# Altium schematic symbol library Diode - Rectifier.SchLib: 777 symbols (part 3 of 4)
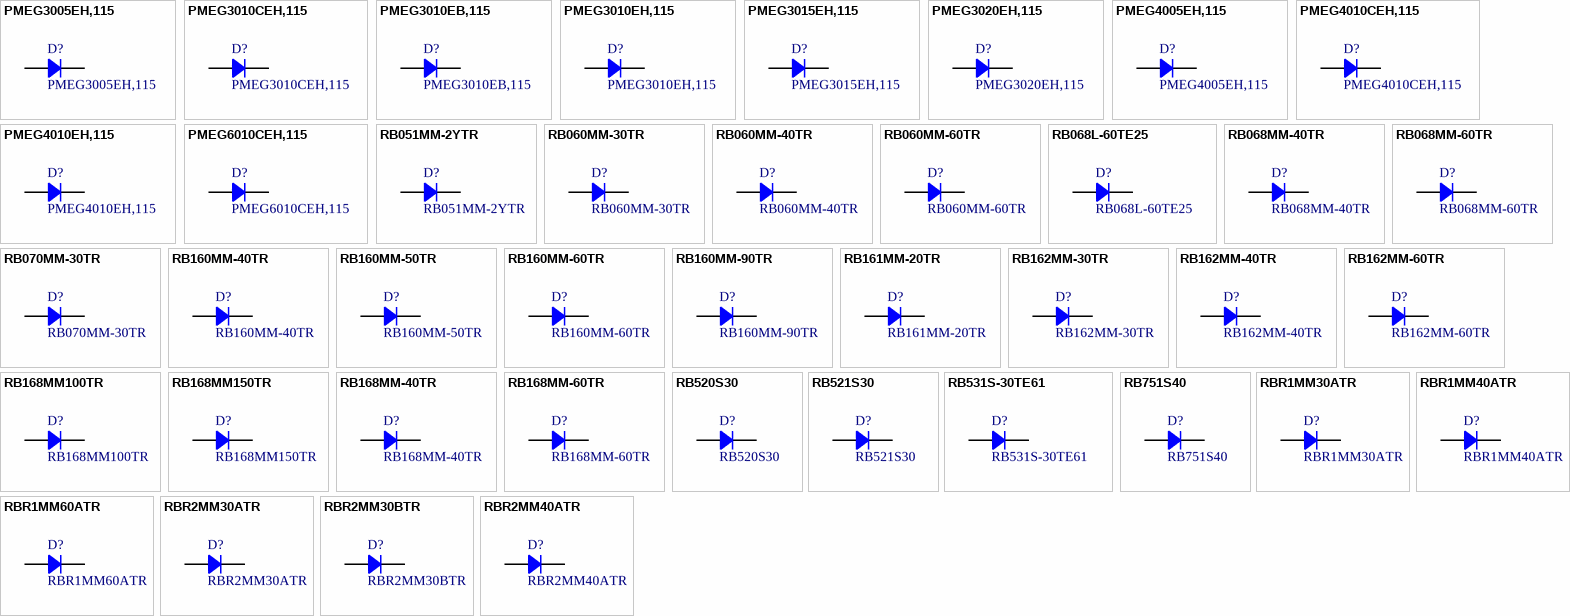
[diagram p21: symbols PMEG3005EH,115 to RBR2MM40ATR]

## RB168MM150TR
designator D?
DIODE SCHOTTKY 150V 1A PMDU; Manufacturer: Rohm Semiconductor; Current Reverse Leakage @ Vr: 4uA @ 150V; Voltage Forward (Vf): 840mV @ 1A; Part Number: RB168MM150TR; PartId: 29299; Supplier 1: Digi-Key; Supplier Part Number 1: RB168MM150CT-ND; ComponentLink1Description: Datasheet; ComponentLink1URL: http://rohmfs.rohm.com/en/products/databook/datasheet/discrete/diode/schottky_barrier/rb168mm150.pdf; ComponentLink2Description: Digi-Key Listing; ComponentLink2URL: https://www.digikey.com/product-detail/en/rohm-semiconductor/RB168MM150TR/RB168MM150CT-ND/5813364; Junction Operating Temperature: 150C (Max); Price: 0.51; Type: Schottky; Device Package: SOD-123F; Voltage DC Reverse (Vr): 150V; Current Rectified: 1A
footprint SOD123F
pins: 1, 2

## RB168MM-40TR
designator D?
DIODE SCHOTTKY 40V 1A PMDU; Manufacturer: Rohm Semiconductor; Current Reverse Leakage @ Vr: 550nA @ 40V; Voltage Forward (Vf): 650mV @ 1A; Part Number: RB168MM-40TR; PartId: 29297; Supplier 1: Digi-Key; Supplier Part Number 1: RB168MM-40CT-ND; ComponentLink1Description: Datasheet; ComponentLink1URL: http://rohmfs.rohm.com/en/products/databook/datasheet/discrete/diode/schottky_barrier/rb168mm-40.pdf; ComponentLink2Description: Digi-Key Listing; ComponentLink2URL: https://www.digikey.com/product-detail/en/rohm-semiconductor/RB168MM-40TR/RB168MM-40CT-ND/5720312; Junction Operating Temperature: 150C (Max); Price: 0.51; Type: Schottky; Device Package: SOD-123F; Voltage DC Reverse (Vr): 40V; Current Rectified: 1A
footprint SOD123F
pins: 1, 2

## RB168MM-60TR
designator D?
DIODE SCHOTTKY 60V 1A PMDU; Manufacturer: Rohm Semiconductor; Current Reverse Leakage @ Vr: 1.5uA @ 60V; Voltage Forward (Vf): 680mV @ 1A; Part Number: RB168MM-60TR; PartId: 29298; Supplier 1: Digi-Key; Supplier Part Number 1: RB168MM-60CT-ND; ComponentLink1Description: Datasheet; ComponentLink1URL: http://rohmfs.rohm.com/en/products/databook/datasheet/discrete/diode/schottky_barrier/rb168mm-60.pdf; ComponentLink2Description: Digi-Key Listing; ComponentLink2URL: https://www.digikey.com/product-detail/en/rohm-semiconductor/RB168MM-60TR/RB168MM-60CT-ND/5813365; Junction Operating Temperature: 150C (Max); Price: 0.51; Type: Schottky; Device Package: SOD-123F; Voltage DC Reverse (Vr): 60V; Current Rectified: 1A
footprint SOD123F
pins: 1, 2

## RB520S30
designator D?
DIODE SCHOTTKY 30V 200MA SOD523F; Manufacturer: Fairchild Semiconductor; Type: Surface Mount; Current Reverse Leakage @ Vr: 1uA @ 10V; Voltage Forward (Vf): 600mV @ 200mA; Part Number: RB520S30; PartId: 7142; Supplier 1: Digi-Key; Supplier Part Number 1: RB520S30TR-ND; ComponentLink1Description: Datasheet; ComponentLink1URL: http://www.fairchildsemi.com/datasheets/RB/RB520S30.pdf; ComponentLink2Description: Digi-Key Listing; ComponentLink2URL: http://www.digikey.ca/product-detail/en/RB520S30/RB520S30TR-ND/1955134; Junction Operating Temperature: -55C ~ 125C; Price: 0.0455; Device Package: SC-79, SOD-523F; Reverse Recovery Time (trr): -; Voltage DC Reverse (Vr): 30V; Current Rectified: 200mA
footprint SOD523F
pins: 1, 2

## RB521S30
designator D?
DIODE SCHOTTKY 30V 200MA SOD523F; Manufacturer: Fairchild Semiconductor; Type: Surface Mount; Current Reverse Leakage @ Vr: 30uA @ 10V; Voltage Forward (Vf): 500mV @ 200mA; Part Number: RB521S30; PartId: 7144; Supplier 1: Digi-Key; Supplier Part Number 1: RB521S30TR-ND; ComponentLink1Description: Datasheet; ComponentLink1URL: http://www.fairchildsemi.com/datasheets/RB/RB521S30.pdf; ComponentLink2Description: Digi-Key Listing; ComponentLink2URL: http://www.digikey.ca/product-detail/en/RB521S30/RB521S30TR-ND/1955135; Junction Operating Temperature: -55C ~ 125C; Price: 0.0455; Device Package: SC-79, SOD-523F; Reverse Recovery Time (trr): -; Voltage DC Reverse (Vr): 30V; Current Rectified: 200mA
footprint SOD523F
pins: 1, 2

## RB531S-30TE61
designator D?
DIODE SCHOTTKY 30V 100MA EMD2; Manufacturer: Rohm Semiconductor; Type: Surface Mount; Current Reverse Leakage @ Vr: 10uA @ 10V; Voltage Forward (Vf): 350mV @ 10mA; Part Number: RB531S-30TE61; PartId: 7148; Supplier 1: Digi-Key; Supplier Part Number 1: RB531S-30TE61TR-ND; ComponentLink1Description: Datasheet; ComponentLink1URL: http://rohmfs.rohm.com/en/products/databook/datasheet/discrete/diode/schottky_barrier/rb531s-30.pdf; ComponentLink2Description: Digi-Key Listing; ComponentLink2URL: http://www.digikey.ca/product-detail/en/RB531S-30TE61/RB531S-30TE61TR-ND/2615623; Junction Operating Temperature: 125C (Max); Price: 0.0915; Device Package: SC-79, SOD-523; Reverse Recovery Time (trr): -; Voltage DC Reverse (Vr): 30V; Current Rectified: 100mA
footprint SOD523F
pins: 1, 2

## RB751S40
designator D?
DIODE SCHOTTKY 40V 30MA SOD523F; Manufacturer: Fairchild Semiconductor; Type: Surface Mount; Current Reverse Leakage @ Vr: 500nA @ 10V; Voltage Forward (Vf): 370mV @ 1mA; Part Number: RB751S40; PartId: 7143; Supplier 1: Digi-Key; Supplier Part Number 1: RB751S40TR-ND; ComponentLink1Description: Datasheet; ComponentLink1URL: http://www.fairchildsemi.com/datasheets/RB/RB751S40.pdf; ComponentLink2Description: Digi-Key Listing; ComponentLink2URL: http://www.digikey.ca/product-detail/en/RB751S40/RB751S40TR-ND/1955136; Junction Operating Temperature: -55C ~ 125C; Price: 0.0455; Device Package: SC-79, SOD-523F; Reverse Recovery Time (trr): -; Voltage DC Reverse (Vr): 40V; Current Rectified: 30mA
footprint SOD523F
pins: 1, 2

## RBR1MM30ATR
designator D?
DIODE SCHOTTKY 30V 1A PMDU; Manufacturer: Rohm Semiconductor; Current Reverse Leakage @ Vr: 50uA @ 30V; Voltage Forward (Vf): 480mV @ 1A; Part Number: RBR1MM30ATR; PartId: 29303; Supplier 1: Digi-Key; Supplier Part Number 1: RBR1MM30ACT-ND; ComponentLink1Description: Datasheet; ComponentLink1URL: http://rohmfs.rohm.com/en/products/databook/datasheet/discrete/diode/schottky_barrier/rbr1mm30a.pdf; ComponentLink2Description: Digi-Key Listing; ComponentLink2URL: https://www.digikey.com/product-detail/en/rohm-semiconductor/RBR1MM30ATR/RBR1MM30ACT-ND/5813369; Junction Operating Temperature: 150C (Max); Price: 0.52; Type: Schottky; Device Package: SOD-123F; Voltage DC Reverse (Vr): 30V; Current Rectified: 1A
footprint SOD123F
pins: 1, 2

## RBR1MM40ATR
designator D?
DIODE SCHOTTKY 40V 1A PMDU; Manufacturer: Rohm Semiconductor; Current Reverse Leakage @ Vr: 50uA @ 40V; Voltage Forward (Vf): 520mV @ 1A; Part Number: RBR1MM40ATR; PartId: 29301; Supplier 1: Digi-Key; Supplier Part Number 1: RBR1MM40ACT-ND; ComponentLink1Description: Datasheet; ComponentLink1URL: http://rohmfs.rohm.com/en/products/databook/datasheet/discrete/diode/schottky_barrier/rbr1mm40a.pdf; ComponentLink2Description: Digi-Key Listing; ComponentLink2URL: https://www.digikey.com/product-detail/en/rohm-semiconductor/RBR1MM40ATR/RBR1MM40ACT-ND/5813370; Junction Operating Temperature: 150C (Max); Price: 0.52; Type: Schottky; Device Package: SOD-123F; Voltage DC Reverse (Vr): 40V; Current Rectified: 1A
footprint SOD123F
pins: 1, 2

## RBR1MM60ATR
designator D?
DIODE SCHOTTKY 60V 1A PMDU; Manufacturer: Rohm Semiconductor; Current Reverse Leakage @ Vr: 75uA @ 60V; Voltage Forward (Vf): 530mV @ 1A; Part Number: RBR1MM60ATR; PartId: 29695; Supplier 1: Digi-Key; Supplier Part Number 1: RBR1MM60ACT-ND; ComponentLink1Description: Datasheet; ComponentLink1URL: http://rohmfs.rohm.com/en/products/databook/datasheet/discrete/diode/schottky_barrier/rbr1mm60a.pdf; ComponentLink2Description: Digi-Key Listing; ComponentLink2URL: https://www.digikey.com/product-detail/en/rohm-semiconductor/RBR1MM60ATR/RBR1MM60ACT-ND/5813371; Junction Operating Temperature: 150C (Max); Price: 0.52; Type: Schottky; Device Package: SOD-123F; Voltage DC Reverse (Vr): 60V; Current Rectified: 1A
footprint SOD123F
pins: 1, 2

## RBR2MM30ATR
designator D?
DIODE SCHOTTKY 30V 2A PMDU; Manufacturer: Rohm Semiconductor; Current Reverse Leakage @ Vr: 50uA @ 30V; Voltage Forward (Vf): 530mV @ 2A; Part Number: RBR2MM30ATR; PartId: 29241; Supplier 1: Digi-Key; Supplier Part Number 1: RBR2MM30ACT-ND; ComponentLink1Description: Datasheet; ComponentLink1URL: http://rohmfs.rohm.com/en/products/databook/datasheet/discrete/diode/schottky_barrier/rbr2mm30a.pdf; ComponentLink2Description: Digi-Key Listing; ComponentLink2URL: https://www.digikey.com/product-detail/en/rohm-semiconductor/RBR2MM30ATR/RBR2MM30ACT-ND/5813376; Junction Operating Temperature: 150C (Max); Price: 0.53; Type: Schottky; Device Package: SOD-123F; Voltage DC Reverse (Vr): 30V; Current Rectified: 2A
footprint SOD123F
pins: 1, 2

## RBR2MM30BTR
designator D?
DIODE SCHOTTKY 30V 2A PMDU; Manufacturer: Rohm Semiconductor; Current Reverse Leakage @ Vr: 80uA @ 30V; Voltage Forward (Vf): 490mV @ 2A; Part Number: RBR2MM30BTR; PartId: 29339; Supplier 1: Digi-Key; Supplier Part Number 1: RBR2MM30BCT-ND; ComponentLink1Description: Datasheet; ComponentLink1URL: http://rohmfs.rohm.com/en/products/databook/datasheet/discrete/diode/schottky_barrier/rbr2mm30b.pdf; ComponentLink2Description: Digi-Key Listing; ComponentLink2URL: https://www.digikey.com/product-detail/en/rohm-semiconductor/RBR2MM30BTR/RBR2MM30BCT-ND/5813377; Junction Operating Temperature: 150C (Max); Price: 0.55; Type: Schottky; Device Package: SOD-123F; Voltage DC Reverse (Vr): 30V; Current Rectified: 2A
footprint SOD123F
pins: 1, 2

## RBR2MM40ATR
designator D?
DIODE SCHOTTKY 40V 2A PMDU; Manufacturer: Rohm Semiconductor; Current Reverse Leakage @ Vr: 50uA @ 40V; Voltage Forward (Vf): 620mV @ 2A; Part Number: RBR2MM40ATR; PartId: 29306; Supplier 1: Digi-Key; Supplier Part Number 1: RBR2MM40ACT-ND; ComponentLink1Description: Datasheet; ComponentLink1URL: http://rohmfs.rohm.com/en/products/databook/datasheet/discrete/diode/schottky_barrier/rbr2mm40a.pdf; ComponentLink2Description: Digi-Key Listing; ComponentLink2URL: https://www.digikey.com/product-detail/en/rohm-semiconductor/RBR2MM40ATR/RBR2MM40ACT-ND/5813378; Junction Operating Temperature: 150C (Max); Price: 0.53; Type: Schottky; Device Package: SOD-123F; Voltage DC Reverse (Vr): 40V; Current Rectified: 2A
footprint SOD123F
pins: 1, 2

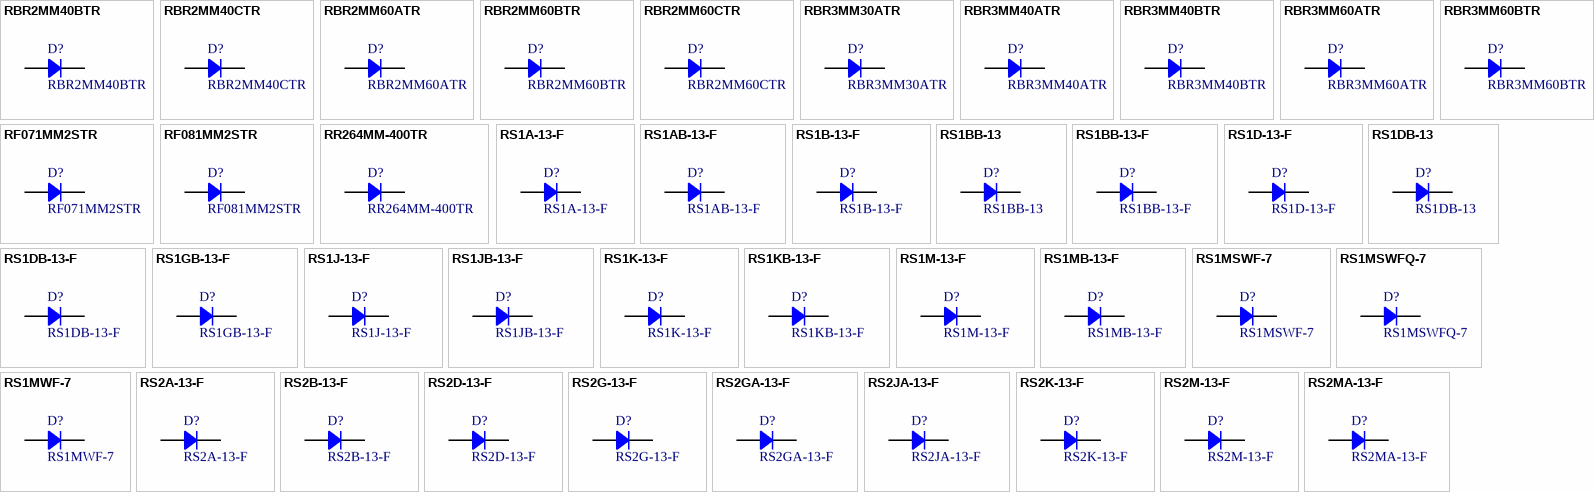
[diagram p11: symbols RBR2MM40BTR to RS2MA-13-F]

## RBR2MM40BTR
designator D?
DIODE SCHOTTKY 40V 2A PMDU; Manufacturer: Rohm Semiconductor; Current Reverse Leakage @ Vr: 80uA @ 40V; Voltage Forward (Vf): 560mV @ 2A; Part Number: RBR2MM40BTR; PartId: 29310; Supplier 1: Digi-Key; Supplier Part Number 1: RBR2MM40BCT-ND; ComponentLink1Description: Datasheet; ComponentLink1URL: http://rohmfs.rohm.com/en/products/databook/datasheet/discrete/diode/schottky_barrier/rbr2mm40b.pdf; ComponentLink2Description: Digi-Key Listing; ComponentLink2URL: https://www.digikey.com/product-detail/en/rohm-semiconductor/RBR2MM40BTR/RBR2MM40BCT-ND/5813379; Junction Operating Temperature: 150C (Max); Price: 0.55; Type: Schottky; Device Package: SOD-123F; Voltage DC Reverse (Vr): 40V; Current Rectified: 2A
footprint SOD123F
pins: 1, 2

## RBR2MM40CTR
designator D?
DIODE SCHOTTKY 40V 2A PMDU; Manufacturer: Rohm Semiconductor; Current Reverse Leakage @ Vr: 100uA @ 40V; Voltage Forward (Vf): 540mV @ 2A; Part Number: RBR2MM40CTR; PartId: 29281; Supplier 1: Digi-Key; Supplier Part Number 1: RBR2MM40CCT-ND; ComponentLink1Description: Datasheet; ComponentLink1URL: http://rohmfs.rohm.com/en/products/databook/datasheet/discrete/diode/schottky_barrier/rbr2mm40c.pdf; ComponentLink2Description: Digi-Key Listing; ComponentLink2URL: https://www.digikey.com/product-detail/en/rohm-semiconductor/RBR2MM40CTR/RBR2MM40CCT-ND/5813380; Junction Operating Temperature: 150C (Max); Price: 0.42; Type: Schottky; Device Package: SOD-123F; Voltage DC Reverse (Vr): 40V; Current Rectified: 2A
footprint SOD123F
pins: 1, 2

## RBR2MM60ATR
designator D?
DIODE SCHOTTKY 60V 2A PMDU; Manufacturer: Rohm Semiconductor; Current Reverse Leakage @ Vr: 75uA @ 60V; Voltage Forward (Vf): 650mV @ 2A; Part Number: RBR2MM60ATR; PartId: 29305; Supplier 1: Digi-Key; Supplier Part Number 1: RBR2MM60ACT-ND; ComponentLink1Description: Datasheet; ComponentLink1URL: http://rohmfs.rohm.com/en/products/databook/datasheet/discrete/diode/schottky_barrier/rbr2mm60a.pdf; ComponentLink2Description: Digi-Key Listing; ComponentLink2URL: https://www.digikey.com/product-detail/en/rohm-semiconductor/RBR2MM60ATR/RBR2MM60ACT-ND/5813381; Junction Operating Temperature: 150C (Max); Price: 0.53; Type: Schottky; Device Package: SOD-123F; Voltage DC Reverse (Vr): 60V; Current Rectified: 2A
footprint SOD123F
pins: 1, 2

## RBR2MM60BTR
designator D?
DIODE SCHOTTKY 60V 2A PMDU; Manufacturer: Rohm Semiconductor; Current Reverse Leakage @ Vr: 100uA @ 60V; Voltage Forward (Vf): 580mV @ 2A; Part Number: RBR2MM60BTR; PartId: 29311; Supplier 1: Digi-Key; Supplier Part Number 1: RBR2MM60BCT-ND; ComponentLink1Description: Datasheet; ComponentLink1URL: http://rohmfs.rohm.com/en/products/databook/datasheet/discrete/diode/schottky_barrier/rbr2mm60b.pdf; ComponentLink2Description: Digi-Key Listing; ComponentLink2URL: https://www.digikey.com/product-detail/en/rohm-semiconductor/RBR2MM60BTR/RBR2MM60BCT-ND/5813382; Junction Operating Temperature: 150C (Max); Price: 0.55; Type: Schottky; Device Package: SOD-123F; Voltage DC Reverse (Vr): 60V; Current Rectified: 2A
footprint SOD123F
pins: 1, 2

## RBR2MM60CTR
designator D?
DIODE SCHOTTKY 60V 2A PMDU; Manufacturer: Rohm Semiconductor; Current Reverse Leakage @ Vr: 120uA @ 60V; Voltage Forward (Vf): 550mV @ 2A; Part Number: RBR2MM60CTR; PartId: 29280; Supplier 1: Digi-Key; Supplier Part Number 1: RBR2MM60CCT-ND; ComponentLink1Description: Datasheet; ComponentLink1URL: http://rohmfs.rohm.com/en/products/databook/datasheet/discrete/diode/schottky_barrier/rbr2mm60c.pdf; ComponentLink2Description: Digi-Key Listing; ComponentLink2URL: https://www.digikey.com/product-detail/en/rohm-semiconductor/RBR2MM60CTR/RBR2MM60CCT-ND/5813383; Junction Operating Temperature: 150C (Max); Price: 0.42; Type: Schottky; Device Package: SOD-123F; Voltage DC Reverse (Vr): 60V; Current Rectified: 2A
footprint SOD123F
pins: 1, 2

## RBR3MM30ATR
designator D?
DIODE SCHOTTKY 30V 3A PMDU; Manufacturer: Rohm Semiconductor; Current Reverse Leakage @ Vr: 100uA @ 30V; Voltage Forward (Vf): 510mV @ 3A; Part Number: RBR3MM30ATR; PartId: 29329; Supplier 1: Digi-Key; Supplier Part Number 1: RBR3MM30ACT-ND; ComponentLink1Description: Datasheet; ComponentLink1URL: http://rohmfs.rohm.com/en/products/databook/datasheet/discrete/diode/schottky_barrier/rbr3mm30a.pdf; ComponentLink2Description: Digi-Key Listing; ComponentLink2URL: https://www.digikey.com/product-detail/en/rohm-semiconductor/RBR3MM30ATR/RBR3MM30ACT-ND/5813390; Junction Operating Temperature: 150C (Max); Price: 0.44; Type: Schottky; Device Package: SOD-123F; Voltage DC Reverse (Vr): 30V; Current Rectified: 3A
footprint SOD123F
pins: 1, 2

## RBR3MM40ATR
designator D?
DIODE SCHOTTKY 40V 3A PMDU; Manufacturer: Rohm Semiconductor; Current Reverse Leakage @ Vr: 80uA @ 40V; Voltage Forward (Vf): 620mV @ 3A; Part Number: RBR3MM40ATR; PartId: 29244; Supplier 1: Digi-Key; Supplier Part Number 1: RBR3MM40ACT-ND; ComponentLink1Description: Datasheet; ComponentLink1URL: http://rohmfs.rohm.com/en/products/databook/datasheet/discrete/diode/schottky_barrier/rbr3mm40a.pdf; ComponentLink2Description: Digi-Key Listing; ComponentLink2URL: https://www.digikey.com/product-detail/en/rohm-semiconductor/RBR3MM40ATR/RBR3MM40ACT-ND/5813391; Junction Operating Temperature: 150C (Max); Price: 0.4; Type: Schottky; Device Package: SOD-123F; Voltage DC Reverse (Vr): 40V; Current Rectified: 3A
footprint SOD123F
pins: 1, 2

## RBR3MM40BTR
designator D?
DIODE SCHOTTKY 40V 3A PMDU; Manufacturer: Rohm Semiconductor; Current Reverse Leakage @ Vr: 100uA @ 40V; Voltage Forward (Vf): 580mV @ 3A; Part Number: RBR3MM40BTR; PartId: 29284; Supplier 1: Digi-Key; Supplier Part Number 1: RBR3MM40BCT-ND; ComponentLink1Description: Datasheet; ComponentLink1URL: http://rohmfs.rohm.com/en/products/databook/datasheet/discrete/diode/schottky_barrier/rbr3mm40b.pdf; ComponentLink2Description: Digi-Key Listing; ComponentLink2URL: https://www.digikey.com/product-detail/en/rohm-semiconductor/RBR3MM40BTR/RBR3MM40BCT-ND/5813392; Junction Operating Temperature: 150C (Max); Price: 0.44; Type: Schottky; Device Package: SOD-123F; Voltage DC Reverse (Vr): 40V; Current Rectified: 3A
footprint SOD123F
pins: 1, 2

## RBR3MM60ATR
designator D?
DIODE SCHOTTKY 60V 3A PMDU; Manufacturer: Rohm Semiconductor; Current Reverse Leakage @ Vr: 100uA @ 60V; Voltage Forward (Vf): 660mV @ 3A; Part Number: RBR3MM60ATR; PartId: 29273; Supplier 1: Digi-Key; Supplier Part Number 1: RBR3MM60ACT-ND; ComponentLink1Description: Datasheet; ComponentLink1URL: http://rohmfs.rohm.com/en/products/databook/datasheet/discrete/diode/schottky_barrier/rbr3mm60a.pdf; ComponentLink2Description: Digi-Key Listing; ComponentLink2URL: https://www.digikey.com/product-detail/en/rohm-semiconductor/RBR3MM60ATR/RBR3MM60ACT-ND/5813393; Junction Operating Temperature: 150C (Max); Price: 0.4; Type: Schottky; Device Package: SOD-123F; Voltage DC Reverse (Vr): 60V; Current Rectified: 3A
footprint SOD123F
pins: 1, 2

## RBR3MM60BTR
designator D?
DIODE SCHOTTKY 60V 3A PMDU; Manufacturer: Rohm Semiconductor; Current Reverse Leakage @ Vr: 120uA @ 60V; Voltage Forward (Vf): 610mV @ 3A; Part Number: RBR3MM60BTR; PartId: 29286; Supplier 1: Digi-Key; Supplier Part Number 1: RBR3MM60BCT-ND; ComponentLink1Description: Datasheet; ComponentLink1URL: http://rohmfs.rohm.com/en/products/databook/datasheet/discrete/diode/schottky_barrier/rbr3mm60b.pdf; ComponentLink2Description: Digi-Key Listing; ComponentLink2URL: https://www.digikey.com/product-detail/en/rohm-semiconductor/RBR3MM60BTR/RBR3MM60BCT-ND/5813394; Junction Operating Temperature: 150C (Max); Price: 0.44; Type: Schottky; Device Package: SOD-123F; Voltage DC Reverse (Vr): 60V; Current Rectified: 3A
footprint SOD123F
pins: 1, 2

## RF071MM2STR
designator D?
DIODE GEN PURP 200V 700MA PMDU; Manufacturer: Rohm Semiconductor; Type: Standard; Current Reverse Leakage @ Vr: 10uA @ 200V; Reverse Recovery Time (trr): 25ns; Voltage Forward (Vf): 850mV @ 700mA; Part Number: RF071MM2STR; PartId: 29230; Supplier 1: Digi-Key; Supplier Part Number 1: RF071MM2SCT-ND; ComponentLink1Description: Datasheet; ComponentLink1URL: http://rohmfs.rohm.com/en/products/databook/datasheet/discrete/diode/fast_recovery/rf071mm2s.pdf; ComponentLink2Description: Digi-Key Listing; ComponentLink2URL: https://www.digikey.com/product-detail/en/rohm-semiconductor/RF071MM2STR/RF071MM2SCT-ND/5001884; Junction Operating Temperature: 150C (Max); Price: 0.54; Device Package: SOD-123F; Voltage DC Reverse (Vr): 200V; Current Rectified: 700mA
footprint SOD123F
pins: 1, 2

## RF081MM2STR
designator D?
DIODE GEN PURP 200V 800MA PMDU; Manufacturer: Rohm Semiconductor; Type: Standard; Current Reverse Leakage @ Vr: 10uA @ 200V; Reverse Recovery Time (trr): 25ns; Voltage Forward (Vf): 950mV @ 800mA; Part Number: RF081MM2STR; PartId: 29270; Supplier 1: Digi-Key; Supplier Part Number 1: RF081MM2SCT-ND; ComponentLink1Description: Datasheet; ComponentLink1URL: http://rohmfs.rohm.com/en/products/databook/datasheet/discrete/diode/fast_recovery/rf081mm2s.pdf; ComponentLink2Description: Digi-Key Listing; ComponentLink2URL: https://www.digikey.com/product-detail/en/rohm-semiconductor/RF081MM2STR/RF081MM2SCT-ND/5001885; Junction Operating Temperature: 150C (Max); Price: 0.39; Device Package: SOD-123F; Voltage DC Reverse (Vr): 200V; Current Rectified: 800mA
footprint SOD123F
pins: 1, 2

## RR264MM-400TR
designator D?
DIODE GEN PURP 400V 1A PMDU; Manufacturer: Rohm Semiconductor; Type: Standard; Current Reverse Leakage @ Vr: 10uA @ 400V; Voltage Forward (Vf): 1.1V @ 700mA; Part Number: RR264MM-400TR; PartId: 29179; Supplier 1: Digi-Key; Supplier Part Number 1: RR264MM-400CT-ND; ComponentLink1Description: Datasheet; ComponentLink1URL: http://rohmfs.rohm.com/en/products/databook/datasheet/discrete/diode/rectifier/rr264mm-400.pdf; ComponentLink2Description: Digi-Key Listing; ComponentLink2URL: https://www.digikey.com/product-detail/en/rohm-semiconductor/RR264MM-400TR/RR264MM-400CT-ND/5001886; Junction Operating Temperature: 150C (Max); Price: 0.29; Device Package: SOD-123F; Voltage DC Reverse (Vr): 400V; Current Rectified: 1A
footprint SOD123F
pins: 1, 2

## RS1A-13-F
designator D?
DIODE GEN PURP 50V 1A SMA; Manufacturer: Diodes Incorporated; Type: Standard; Current Reverse Leakage @ Vr: 5uA @ 50V; Reverse Recovery Time (trr): 150ns; Voltage Forward (Vf): 1.3V @ 1A; Part Number: RS1A-13-F; PartId: 16347; Supplier 1: Digi-Key; Supplier Part Number 1: RS1A-FDITR-ND; ComponentLink1Description: Datasheet; ComponentLink1URL: http://www.diodes.com/_files/datasheets/ds15002.pdf; ComponentLink2Description: Digi-Key Listing; ComponentLink2URL: https://www.digikey.com/product-detail/en/diodes-incorporated/RS1A-13-F/RS1A-FDITR-ND/751523; Junction Operating Temperature: -65C ~ 150C; Price: 0.072; Device Package: DO-214AC, SMA; Voltage DC Reverse (Vr): 50V; Current Rectified: 1A
footprint DO214AC SMA
pins: 1, 2

## RS1AB-13-F
designator D?
DIODE GEN PURP 50V 1A SMB; Manufacturer: Diodes Incorporated; Type: Standard; Current Reverse Leakage @ Vr: 5uA @ 50V; Reverse Recovery Time (trr): 150ns; Voltage Forward (Vf): 1.3V @ 1A; Part Number: RS1AB-13-F; PartId: 16274; Supplier 1: Digi-Key; Supplier Part Number 1: RS1AB-FDITR-ND; ComponentLink1Description: Datasheet; ComponentLink1URL: http://www.diodes.com/_files/datasheets/ds15002.pdf; ComponentLink2Description: Digi-Key Listing; ComponentLink2URL: https://www.digikey.com/product-detail/en/diodes-incorporated/RS1AB-13-F/RS1AB-FDITR-ND/814456; Junction Operating Temperature: -65C ~ 150C; Price: 0.0864; Device Package: DO-214AA, SMB; Voltage DC Reverse (Vr): 50V; Current Rectified: 1A
footprint DO214AA SMB
pins: 1, 2

## RS1B-13-F
designator D?
DIODE GEN PURP 100V 1A SMA; Manufacturer: Diodes Incorporated; Type: Standard; Current Reverse Leakage @ Vr: 5uA @ 100V; Reverse Recovery Time (trr): 150ns; Voltage Forward (Vf): 1.3V @ 1A; Part Number: RS1B-13-F; PartId: 16320; Supplier 1: Digi-Key; Supplier Part Number 1: RS1B-FDITR-ND; ComponentLink1Description: Datasheet; ComponentLink1URL: http://www.diodes.com/_files/datasheets/ds15002.pdf; ComponentLink2Description: Digi-Key Listing; ComponentLink2URL: https://www.digikey.com/product-detail/en/diodes-incorporated/RS1B-13-F/RS1B-FDITR-ND/717796; Junction Operating Temperature: -65C ~ 150C; Price: 0.072; Device Package: DO-214AC, SMA; Voltage DC Reverse (Vr): 100V; Current Rectified: 1A
footprint DO214AC SMA
pins: 1, 2

## RS1BB-13
designator D?
DIODE GEN PURP 100V 1A SMB; Manufacturer: Diodes Incorporated; Type: Standard; Current Reverse Leakage @ Vr: 5uA @ 100V; Reverse Recovery Time (trr): 150ns; Voltage Forward (Vf): 1.3V @ 1A; Part Number: RS1BB-13; PartId: 16310; Supplier 1: Digi-Key; Supplier Part Number 1: 981-RS1BB-13-CHP; ComponentLink1Description: Datasheet; ComponentLink1URL: //media.digikey.com/pdf/Data%20Sheets/Diodes%20PDFs/RS1.pdf; ComponentLink2Description: Digi-Key Listing; ComponentLink2URL: https://www.digikey.com/product-detail/en/diodes-incorporated/RS1BB-13/981-RS1BB-13-CHP/2348233; Junction Operating Temperature: -65C ~ 150C; Price: 0.1262; Device Package: DO-214AA, SMB; Voltage DC Reverse (Vr): 100V; Current Rectified: 1A
footprint DO214AA SMB
pins: 1, 2

## RS1BB-13-F
designator D?
DIODE GEN PURP 100V 1A SMB; Manufacturer: Diodes Incorporated; Type: Standard; Current Reverse Leakage @ Vr: 5uA @ 100V; Reverse Recovery Time (trr): 150ns; Voltage Forward (Vf): 1.3V @ 1A; Part Number: RS1BB-13-F; PartId: 16286; Supplier 1: Digi-Key; Supplier Part Number 1: RS1BB-FDITR-ND; ComponentLink1Description: Datasheet; ComponentLink1URL: http://www.diodes.com/_files/datasheets/ds15002.pdf; ComponentLink2Description: Digi-Key Listing; ComponentLink2URL: https://www.digikey.com/product-detail/en/diodes-incorporated/RS1BB-13-F/RS1BB-FDITR-ND/814460; Junction Operating Temperature: -65C ~ 150C; Price: 0.1402; Device Package: DO-214AA, SMB; Voltage DC Reverse (Vr): 100V; Current Rectified: 1A
footprint DO214AA SMB
pins: 1, 2

## RS1D-13-F
designator D?
DIODE GEN PURP 200V 1A SMA; Manufacturer: Diodes Incorporated; Type: Standard; Current Reverse Leakage @ Vr: 5uA @ 200V; Reverse Recovery Time (trr): 150ns; Voltage Forward (Vf): 1.3V @ 1A; Part Number: RS1D-13-F; PartId: 16322; Supplier 1: Digi-Key; Supplier Part Number 1: RS1D-FDITR-ND; ComponentLink1Description: Datasheet; ComponentLink1URL: http://www.diodes.com/_files/datasheets/ds15002.pdf; ComponentLink2Description: Digi-Key Listing; ComponentLink2URL: https://www.digikey.com/product-detail/en/diodes-incorporated/RS1D-13-F/RS1D-FDITR-ND/775844; Junction Operating Temperature: -65C ~ 150C; Price: 0.0743; Device Package: DO-214AC, SMA; Voltage DC Reverse (Vr): 200V; Current Rectified: 1A
footprint DO214AC SMA
pins: 1, 2

## RS1DB-13
designator D?
DIODE GEN PURP 200V 1A SMB; Manufacturer: Diodes Incorporated; Type: Standard; Current Reverse Leakage @ Vr: 5uA @ 200V; Reverse Recovery Time (trr): 150ns; Voltage Forward (Vf): 1.3V @ 1A; Part Number: RS1DB-13; PartId: 16311; Supplier 1: Digi-Key; Supplier Part Number 1: 981-RS1DB-13-CHP; ComponentLink1Description: Datasheet; ComponentLink1URL: //media.digikey.com/pdf/Data%20Sheets/Diodes%20PDFs/RS1.pdf; ComponentLink2Description: Digi-Key Listing; ComponentLink2URL: https://www.digikey.com/product-detail/en/diodes-incorporated/RS1DB-13/981-RS1DB-13-CHP/2344483; Junction Operating Temperature: -65C ~ 150C; Price: 0.1395; Device Package: DO-214AA, SMB; Voltage DC Reverse (Vr): 200V; Current Rectified: 1A
footprint DO214AA SMB
pins: 1, 2

## RS1DB-13-F
designator D?
DIODE GEN PURP 200V 1A SMB; Manufacturer: Diodes Incorporated; Type: Standard; Current Reverse Leakage @ Vr: 5uA @ 200V; Reverse Recovery Time (trr): 150ns; Voltage Forward (Vf): 1.3V @ 1A; Part Number: RS1DB-13-F; PartId: 16240; Supplier 1: Digi-Key; Supplier Part Number 1: RS1DB-FDITR-ND; ComponentLink1Description: Datasheet; ComponentLink1URL: http://www.diodes.com/_files/datasheets/ds15002.pdf; ComponentLink2Description: Digi-Key Listing; ComponentLink2URL: https://www.digikey.com/product-detail/en/diodes-incorporated/RS1DB-13-F/RS1DB-FDITR-ND/814459; Junction Operating Temperature: -65C ~ 150C; Price: 0.0882; Device Package: DO-214AA, SMB; Voltage DC Reverse (Vr): 200V; Current Rectified: 1A
footprint DO214AA SMB
pins: 1, 2

## RS1GB-13-F
designator D?
DIODE GEN PURP 400V 1A SMB; Manufacturer: Diodes Incorporated; Type: Standard; Current Reverse Leakage @ Vr: 5uA @ 400V; Reverse Recovery Time (trr): 150ns; Voltage Forward (Vf): 1.3V @ 1A; Part Number: RS1GB-13-F; PartId: 16277; Supplier 1: Digi-Key; Supplier Part Number 1: RS1GB-FDITR-ND; ComponentLink1Description: Datasheet; ComponentLink1URL: http://www.diodes.com/_files/datasheets/ds15002.pdf; ComponentLink2Description: Digi-Key Listing; ComponentLink2URL: https://www.digikey.com/product-detail/en/diodes-incorporated/RS1GB-13-F/RS1GB-FDITR-ND/765419; Junction Operating Temperature: -65C ~ 150C; Price: 0.0936; Device Package: DO-214AA, SMB; Voltage DC Reverse (Vr): 400V; Current Rectified: 1A
footprint DO214AA SMB
pins: 1, 2

## RS1J-13-F
designator D?
DIODE GEN PURP 600V 1A SMA; Manufacturer: Diodes Incorporated; Type: Standard; Current Reverse Leakage @ Vr: 5uA @ 600V; Reverse Recovery Time (trr): 250ns; Voltage Forward (Vf): 1.3V @ 1A; Part Number: RS1J-13-F; PartId: 16321; Supplier 1: Digi-Key; Supplier Part Number 1: RS1J-FDITR-ND; ComponentLink1Description: Datasheet; ComponentLink1URL: http://www.diodes.com/_files/datasheets/ds15002.pdf; ComponentLink2Description: Digi-Key Listing; ComponentLink2URL: https://www.digikey.com/product-detail/en/diodes-incorporated/RS1J-13-F/RS1J-FDITR-ND/749974; Junction Operating Temperature: -65C ~ 150C; Price: 0.072; Device Package: DO-214AC, SMA; Voltage DC Reverse (Vr): 600V; Current Rectified: 1A
footprint DO214AC SMA
pins: 1, 2

## RS1JB-13-F
designator D?
DIODE GEN PURP 600V 1A SMB; Manufacturer: Diodes Incorporated; Type: Standard; Current Reverse Leakage @ Vr: 5uA @ 600V; Reverse Recovery Time (trr): 250ns; Voltage Forward (Vf): 1.3V @ 1A; Part Number: RS1JB-13-F; PartId: 16276; Supplier 1: Digi-Key; Supplier Part Number 1: RS1JB-FDITR-ND; ComponentLink1Description: Datasheet; ComponentLink1URL: http://www.diodes.com/_files/datasheets/ds15002.pdf; ComponentLink2Description: Digi-Key Listing; ComponentLink2URL: https://www.digikey.com/product-detail/en/diodes-incorporated/RS1JB-13-F/RS1JB-FDITR-ND/814458; Junction Operating Temperature: -65C ~ 150C; Price: 0.0936; Device Package: DO-214AA, SMB; Voltage DC Reverse (Vr): 600V; Current Rectified: 1A
footprint DO214AA SMB
pins: 1, 2

## RS1K-13-F
designator D?
DIODE GEN PURP 800V 1A SMA; Manufacturer: Diodes Incorporated; Type: Standard; Current Reverse Leakage @ Vr: 5uA @ 800V; Reverse Recovery Time (trr): 500ns; Voltage Forward (Vf): 1.3V @ 1A; Part Number: RS1K-13-F; PartId: 16354; Supplier 1: Digi-Key; Supplier Part Number 1: RS1K-FDITR-ND; ComponentLink1Description: Datasheet; ComponentLink1URL: http://www.diodes.com/_files/datasheets/ds15002.pdf; ComponentLink2Description: Digi-Key Listing; ComponentLink2URL: https://www.digikey.com/product-detail/en/diodes-incorporated/RS1K-13-F/RS1K-FDITR-ND/749975; Junction Operating Temperature: -65C ~ 150C; Price: 0.0935; Device Package: DO-214AC, SMA; Voltage DC Reverse (Vr): 800V; Current Rectified: 1A
footprint DO214AC SMA
pins: 1, 2

## RS1KB-13-F
designator D?
DIODE GEN PURP 800V 1A SMB; Manufacturer: Diodes Incorporated; Type: Standard; Current Reverse Leakage @ Vr: 5uA @ 800V; Reverse Recovery Time (trr): 500ns; Voltage Forward (Vf): 1.3V @ 1A; Part Number: RS1KB-13-F; PartId: 16300; Supplier 1: Digi-Key; Supplier Part Number 1: RS1KB-FDITR-ND; ComponentLink1Description: Datasheet; ComponentLink1URL: http://www.diodes.com/_files/datasheets/ds15002.pdf; ComponentLink2Description: Digi-Key Listing; ComponentLink2URL: https://www.digikey.com/product-detail/en/diodes-incorporated/RS1KB-13-F/RS1KB-FDITR-ND/814457; Junction Operating Temperature: -65C ~ 150C; Price: 0.1039; Device Package: DO-214AA, SMB; Voltage DC Reverse (Vr): 800V; Current Rectified: 1A
footprint DO214AA SMB
pins: 1, 2

## RS1M-13-F
designator D?
DIODE GEN PURP 1KV 1A SMA; Manufacturer: Diodes Incorporated; Type: Standard; Current Reverse Leakage @ Vr: 5uA @ 1000V; Reverse Recovery Time (trr): 500ns; Voltage DC Reverse (Vr): 1000V (1kV); Voltage Forward (Vf): 1.3V @ 1A; Part Number: RS1M-13-F; PartId: 16326; Supplier 1: Digi-Key; Supplier Part Number 1: RS1M-FDITR-ND; ComponentLink1Description: Datasheet; ComponentLink1URL: http://www.diodes.com/_files/datasheets/ds15002.pdf; ComponentLink2Description: Digi-Key Listing; ComponentLink2URL: https://www.digikey.com/product-detail/en/diodes-incorporated/RS1M-13-F/RS1M-FDITR-ND/775742; Junction Operating Temperature: -65C ~ 150C; Price: 0.0935; Device Package: DO-214AC, SMA; Current Rectified: 1A
footprint DO214AC SMA
pins: 1, 2

## RS1MB-13-F
designator D?
DIODE GEN PURP 1KV 1A SMB; Manufacturer: Diodes Incorporated; Type: Standard; Current Reverse Leakage @ Vr: 5uA @ 1000V; Reverse Recovery Time (trr): 500ns; Voltage DC Reverse (Vr): 1000V (1kV); Voltage Forward (Vf): 1.3V @ 1A; Part Number: RS1MB-13-F; PartId: 16246; Supplier 1: Digi-Key; Supplier Part Number 1: RS1MB-FDITR-ND; ComponentLink1Description: Datasheet; ComponentLink1URL: http://www.diodes.com/_files/datasheets/ds15002.pdf; ComponentLink2Description: Digi-Key Listing; ComponentLink2URL: https://www.digikey.com/product-detail/en/diodes-incorporated/RS1MB-13-F/RS1MB-FDITR-ND/724960; Junction Operating Temperature: -65C ~ 150C; Price: 0.1155; Device Package: DO-214AA, SMB; Current Rectified: 1A
footprint DO214AA SMB
pins: 1, 2

## RS1MSWF-7
designator D?
DIODE RECT STD 1000V 1A SOD123F; Manufacturer: Diodes Incorporated; Type: Standard; Current Reverse Leakage @ Vr: 10uA @ 1000V; Reverse Recovery Time (trr): 500ns; Voltage DC Reverse (Vr): 1000V (1kV); Voltage Forward (Vf): 1.3V @ 1A; Part Number: RS1MSWF-7; PartId: 29274; Supplier 1: Digi-Key; Supplier Part Number 1: RS1MSWF-7DICT-ND; ComponentLink1Description: Datasheet; ComponentLink1URL: http://www.diodes.com/_files/datasheets/RS1MSWF.pdf; ComponentLink2Description: Digi-Key Listing; ComponentLink2URL: https://www.digikey.com/product-detail/en/diodes-incorporated/RS1MSWF-7/RS1MSWF-7DICT-ND/5731845; Junction Operating Temperature: -55C ~ 150C; Price: 0.4; Device Package: SOD-123F; Current Rectified: 1A
footprint SOD123F
pins: 1, 2

## RS1MSWFQ-7
designator D?
DIODE REC FAS 1000V 1A SOD123F; Manufacturer: Diodes Incorporated; Type: Standard; Current Reverse Leakage @ Vr: 10uA @ 1000V; Reverse Recovery Time (trr): 500ns; Voltage DC Reverse (Vr): 1000V (1kV); Voltage Forward (Vf): 1.3V @ 1A; Part Number: RS1MSWFQ-7; PartId: 29246; Supplier 1: Digi-Key; Supplier Part Number 1: RS1MSWFQ-7DICT-ND; ComponentLink1Description: Datasheet; ComponentLink1URL: http://www.diodes.com/_files/datasheets/RS1MSWFQ.pdf; ComponentLink2Description: Digi-Key Listing; ComponentLink2URL: https://www.digikey.com/product-detail/en/diodes-incorporated/RS1MSWFQ-7/RS1MSWFQ-7DICT-ND/5731846; Junction Operating Temperature: -55C ~ 150C; Price: 0.37; Device Package: SOD-123F; Current Rectified: 1A
footprint SOD123F
pins: 1, 2

## RS1MWF-7
designator D?
RECT FAST REC 1000V 1A SOD123F; Manufacturer: Diodes Incorporated; Type: Standard; Current Reverse Leakage @ Vr: 5uA @ 1000V; Reverse Recovery Time (trr): 500ns; Voltage DC Reverse (Vr): 1000V (1kV); Voltage Forward (Vf): 1.3V @ 1A; Part Number: RS1MWF-7; PartId: 29328; Supplier 1: Digi-Key; Supplier Part Number 1: RS1MWF-7DICT-ND; ComponentLink1Description: Datasheet; ComponentLink1URL: http://diodes.com/_files/datasheets/RS1MWF.pdf; ComponentLink2Description: Digi-Key Listing; ComponentLink2URL: https://www.digikey.com/product-detail/en/diodes-incorporated/RS1MWF-7/RS1MWF-7DICT-ND/5235979; Junction Operating Temperature: -55C ~ 150C; Price: 0.43; Device Package: SOD-123F; Current Rectified: 1A
footprint SOD123F
pins: 1, 2

## RS2A-13-F
designator D?
DIODE GEN PURP 50V 1.5A SMB; Manufacturer: Diodes Incorporated; Type: Standard; Current Reverse Leakage @ Vr: 5uA @ 50V; Reverse Recovery Time (trr): 150ns; Voltage Forward (Vf): 1.3V @ 1.5A; Part Number: RS2A-13-F; PartId: 16312; Supplier 1: Digi-Key; Supplier Part Number 1: RS2A-FDITR-ND; ComponentLink1Description: Datasheet; ComponentLink1URL: http://www.diodes.com/_files/datasheets/ds15004.pdf; ComponentLink2Description: Digi-Key Listing; ComponentLink2URL: https://www.digikey.com/product-detail/en/diodes-incorporated/RS2A-13-F/RS2A-FDITR-ND/814455; Junction Operating Temperature: -65C ~ 150C; Price: 0.155; Device Package: DO-214AA, SMB; Voltage DC Reverse (Vr): 50V; Current Rectified: 1.5A
footprint DO214AA SMB
pins: 1, 2

## RS2B-13-F
designator D?
DIODE GEN PURP 100V 1.5A SMB; Manufacturer: Diodes Incorporated; Type: Standard; Current Reverse Leakage @ Vr: 5uA @ 100V; Reverse Recovery Time (trr): 150ns; Voltage Forward (Vf): 1.3V @ 1.5A; Part Number: RS2B-13-F; PartId: 16313; Supplier 1: Digi-Key; Supplier Part Number 1: 1034-RS2B-FDITR-ND; ComponentLink1Description: Datasheet; ComponentLink1URL: http://www.diodes.com/_files/datasheets/ds15004.pdf; ComponentLink2Description: Digi-Key Listing; ComponentLink2URL: https://www.digikey.com/product-detail/en/diodes-incorporated/RS2B-13-F/1034-RS2B-FDITR-ND/5629301; Junction Operating Temperature: -65C ~ 150C; Price: 0.1627; Device Package: DO-214AA, SMB; Voltage DC Reverse (Vr): 100V; Current Rectified: 1.5A
footprint DO214AA SMB
pins: 1, 2

## RS2D-13-F
designator D?